# Altium footprint library LSCB.PcbLib: 64 footprints (part 1 of 4)
Each footprint in its own frame and in the unit in brackets; x right, y up, seen from the top. Pads: shape width x height; smd on the part's side, far side on the other; paste and mask are expansions set on the pad; w line width, h text height; cw(c..) or ccw(c..) is an arc to the next point about the centre after c.
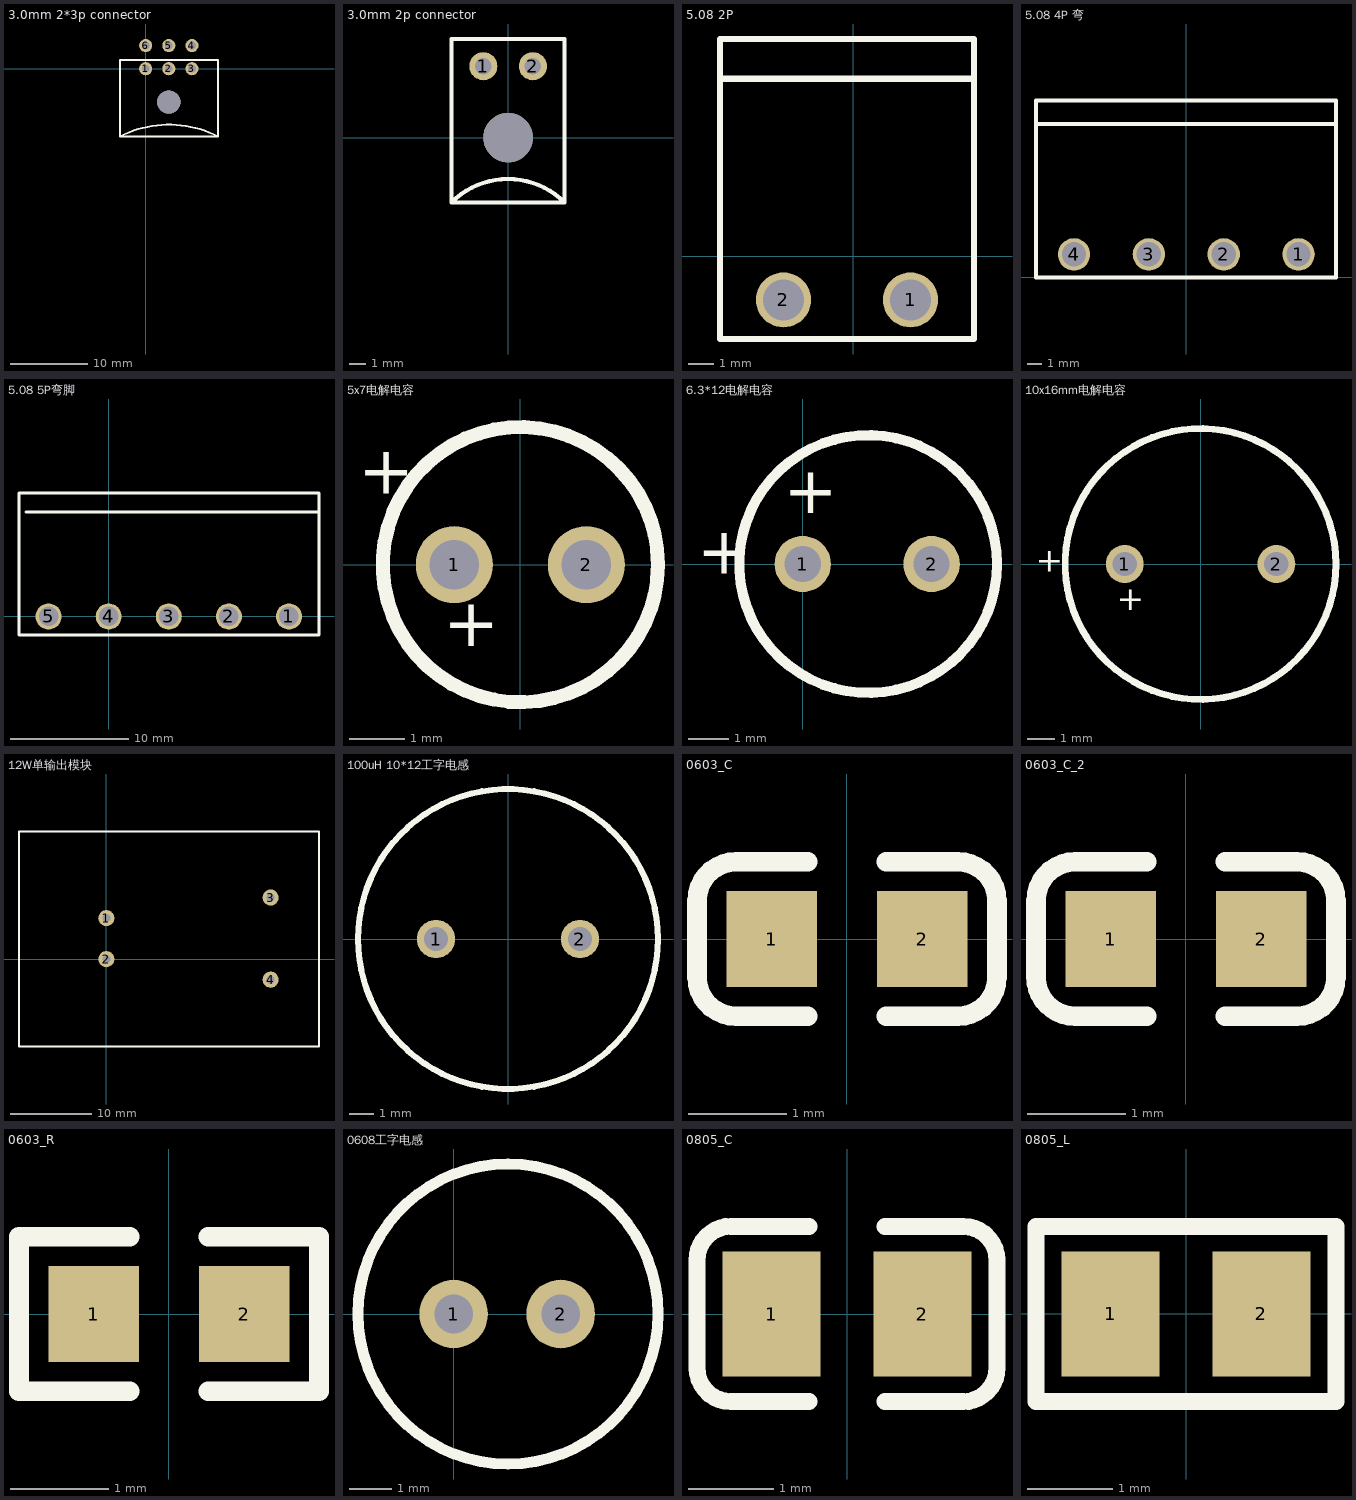
[diagram p0: the footprints below, top view; thin cyan lines are the x and y axes]

## 3.0mm 2*3p connector [mm]
pads (7):
  round 1.7 hole 1: 1(0,0) 2(3,0) 3(6,0) 4(6,3) 5(3,3) 6(0,3)
  round 3 hole 3 unplated: ""(3,-4.32)
Top Overlay:
  lines w0.254: -3.302,-8.763 cw(c3.023,-21.126) 9.348,-8.763 ; -3.302,-8.763 -3.302,1.137 9.348,1.137 9.348,-8.763 ; -3.302,-8.763 9.348,-8.763

## 3.0mm 2p connector [mm]
pads (3):
  round 1.7 hole 1: 1(-1.5,4.32) 2(1.5,4.32)
  round 3 hole 3 unplated: ""(0,0)
Top Overlay:
  lines w0.254: -3.429,-3.931 cw(c-0.004,-7.356) 3.421,-3.931 ; -3.429,-3.931 -3.429,5.969 3.421,5.969 3.421,-3.931 ; -3.429,-3.931 3.421,-3.931

## 5.08 2P [mm]
pads (2):
  round 2.2 hole 1.65: 1(2.286,-1.738) 2(-2.794,-1.738)
Top Overlay:
  lines w0.254: -5.334,7.112 4.826,7.112 ; 4.826,8.636 4.826,-3.302 -5.334,-3.302 -5.334,8.698 4.826,8.698

## 5.08 4P 弯 [mm]
pads (5):
  round 2.2 hole 1.65: 1(7.62,1.564) 2(2.54,1.564) 3(-2.54,1.564) 4(-7.62,1.564) 4(-7.62,1.564)
Top Overlay:
  lines w0.254: -10.2,10.414 10.16,10.414 ; 10.16,11.938 10.16,0 -10.2,0 -10.2,12 10.16,12

## 5.08 5P弯脚 [mm]
pads (6):
  round 2.2 hole 1.65: 1(15.22,-0.036) 2(10.14,-0.036) 3(5.06,-0.036) 4(-0.02,-0.036) 4(-0.02,-0.036) 5(-5.1,-0.036)
Top Overlay:
  lines w0.254: -7,8.814 17.76,8.814 ; 17.76,10.338 17.76,-1.6 -7.6,-1.6 -7.6,10.4 17.76,10.4

## 5x7电解电容 [mm]
height 7
pads (2):
  round 1.4 hole 0.9: 1(-1.2,0) 2(1.2,0)
Top Overlay:
  circle w0.254: c0,0 r2.5
  text "+" at -2.95,1 h1.52
  text "+" at -1.4,-1.775 h1.52

## 6.3*12电解电容 [mm]
pads (2):
  round 1.4 hole 0.9: 1(0,0) 2(3.2,0)
Top Overlay:
  circle w0.254: c1.625,0 r3.2
  text "+" at -0.475,0.875 h2
  text "+" at -2.625,-0.625 h2

## 10x16mm电解电容 [mm]
height 16
pads (2):
  round 1.4 hole 0.9: 1(-2.8,0) 2(2.8,0)
Top Overlay:
  circle w0.254: c0,0 r5
  text "+" at -3.1,-2 h1.52
  text "+" at -6.075,-0.575 h1.52

## 12W单输出模块 [mm]
pads (4):
  round 2 hole 1: 1(0,5.08) 2(0,0) 3(20.32,7.62) 4(20.32,-2.54)
Top Overlay:
  lines w0.254: -10.8,-10.8 26.3,-10.8 ; -10.8,-10.71 -10.8,15.79 ; -10.795,15.79 26.3,15.79 26.3,-10.71
3D body "12W电源模块.SLDPRT": height 17.1, standoff -4.6, extent -11.049,-10.833 25.951,16.167

## 100uH 10*12工字电感 [mm]
pads (2):
  round 1.6 hole 1: 1(-3,0) 2(3,0)
Top Overlay:
  circle w0.254: c0,0 r6.25

## 0603_C [mm]
pads (2):
  rect 0.93x0.98 smd: 1(-0.77,0) 2(0.77,0)
Top Overlay:
  lines w0.2: -0.4,-0.79 -1.135,-0.79 cw(c-1.135,-0.39) -1.535,-0.39 -1.535,0.39 cw(c-1.135,0.39) -1.135,0.79 -0.4,0.79 ; 0.4,-0.79 1.135,-0.79 ccw(c1.135,-0.39) 1.535,-0.39 1.535,0.39 ccw(c1.135,0.39) 1.135,0.79 0.4,0.79
3D body "User Library-0603 SMD Capacitor.STEP": height 0.3, standoff 0, extent -0.8,-0.4 0.8,0.4

## 0603_C_2 [mm]
pads (2):
  rect 0.93x0.98 smd: 1(-0.77,0) 2(0.77,0)
Top Overlay:
  lines w0.2: -0.4,-0.79 -1.135,-0.79 cw(c-1.135,-0.39) -1.535,-0.39 -1.535,0.39 cw(c-1.135,0.39) -1.135,0.79 -0.4,0.79 ; 0.4,-0.79 1.135,-0.79 ccw(c1.135,-0.39) 1.535,-0.39 1.535,0.39 ccw(c1.135,0.39) 1.135,0.79 0.4,0.79
3D body "User Library-0603 SMD Capacitor.STEP": height 0.3, standoff 0, extent -0.8,-0.4 0.8,0.4

## 0603_R [mm]
pads (2):
  rect 0.93x0.98 smd: 1(-0.77,0) 2(0.77,0)
Top Overlay:
  lines w0.2: -0.4,-0.79 -1.535,-0.79 -1.535,0.79 -0.4,0.79 ; 0.4,-0.79 1.535,-0.79 1.535,0.79 0.4,0.79
3D body "User Library-RES_1609-0603.STEP": height 0.56, standoff 0, extent -0.85,-0.4 0.85,0.4

## 0608工字电感 [mm] "11*r2.5"
pads (2):
  round 1.6 hole 0.9: 1(0,0) 2(2.5,0)
Top Overlay:
  circle w0.254: c1.27,0 r3.5
3D body "工字电感.SLDPRT": height 11.02, standoff -2.98, extent -1.947,-3.228 4.516,3.229

## 0805_C [mm]
pads (2):
  rect 1.16x1.47 smd: 1(-0.89,0) 2(0.89,0)
Top Overlay:
  lines w0.2: -0.45,-1.035 -1.37,-1.035 cw(c-1.37,-0.635) -1.77,-0.635 -1.77,0.635 cw(c-1.37,0.635) -1.37,1.035 -0.45,1.035 ; 0.45,-1.035 1.37,-1.035 ccw(c1.37,-0.635) 1.77,-0.635 1.77,0.635 ccw(c1.37,0.635) 1.37,1.035 0.45,1.035
3D body "User Library-0805 SMD Capacitor.STEP": height 0.77, standoff -0.01, extent -0.999,-0.625 1.001,0.625

## 0805_L [mm]
pads (2):
  rect 1.16x1.47 smd: 1(-0.89,0) 2(0.89,0)
Top Overlay:
  lines w0.2: -1.77,-1.035 -1.77,1.035 1.77,1.035 1.77,-1.035 -1.77,-1.035
3D body "L0805.STEP": height 0.6, standoff -0.02, extent -1.022,-0.637 1.028,0.638